# Altium footprint library MyPCBLib.PcbLib: 168 footprints (part 3 of 11)
Each footprint in its own frame and in the unit in brackets; x right, y up, seen from the top. Pads: shape width x height; smd on the part's side, far side on the other; paste and mask are expansions set on the pad; w line width, h text height; cw(c..) or ccw(c..) is an arc to the next point about the centre after c.
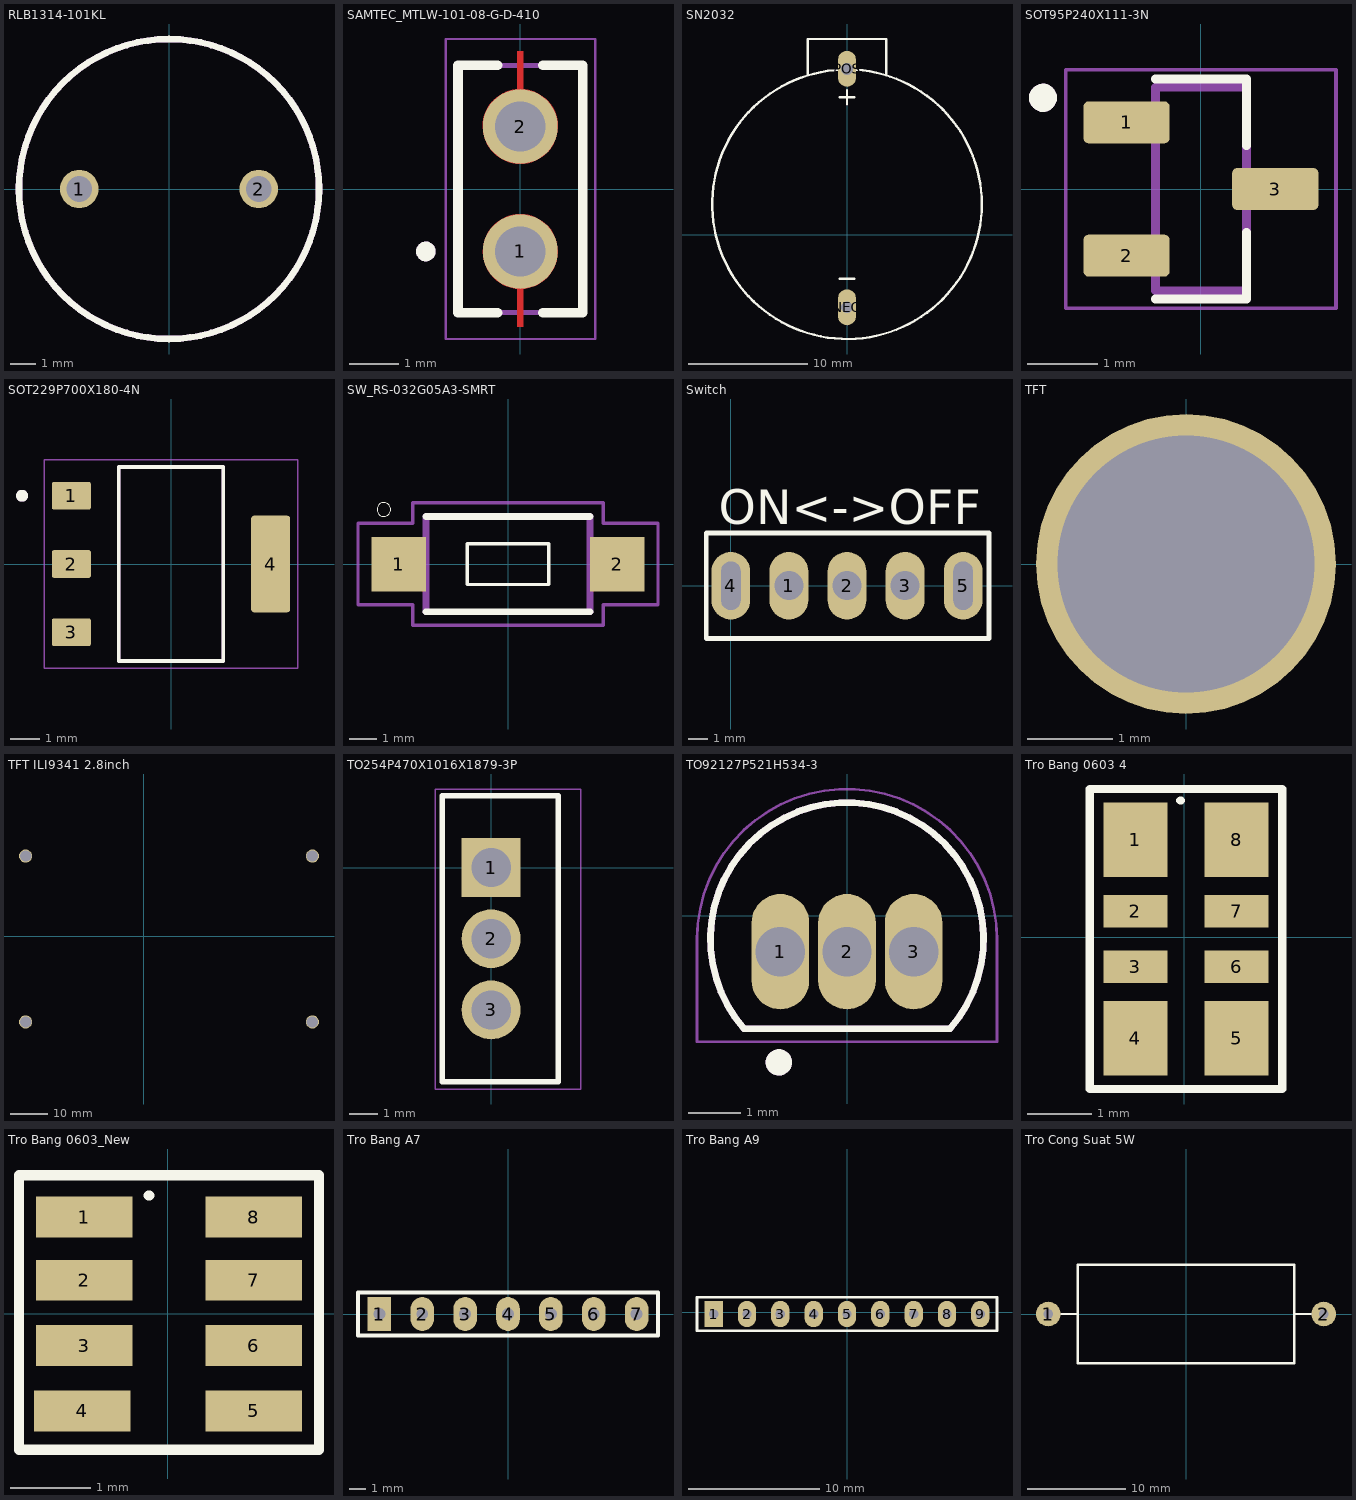
[diagram p2: the footprints below, top view; thin cyan lines are the x and y axes]

## RLB1314-101KL [mm]
pads (2):
  round 1.5 hole 1: 1(-3.5,0) 2(3.5,0)
Top Overlay:
  circle w0.254: c0,0 r5.85
Mechanical 13:
  circle w0.254: c0,0 r5.85
3D body "RLB1314-101KL.stp": height 13, standoff -20, extent -5.85,-5.85 5.85,5.85

## SAMTEC_MTLW-101-08-G-D-410 [mm]
pads (2):
  round 1.52 hole 1.02: 1(0,-1.27) 2(0,1.27)
Top Layer:
  region: 0.079,-0.514 0.158,-0.527 0.235,-0.547 0.309,-0.576 0.38,-0.612 0.447,-0.655 0.509,-0.705 0.565,-0.761 0.615,-0.823 0.658,-0.89 0.694,-0.961 0.723,-1.035 0.743,-1.112 0.756,-1.191 0.76,-1.27 0.759,-1.308 0.756,-1.346 0.752,-1.383 0.745,-1.421 0.737,-1.457 0.727,-1.494 0.715,-1.529 0.701,-1.564 0.686,-1.599 0.669,-1.633 0.65,-1.665 0.63,-1.697 0.608,-1.728 0.585,-1.757 0.56,-1.786 0.534,-1.813 0.506,-1.839 0.477,-1.863 0.448,-1.886 0.417,-1.908 0.385,-1.928 0.352,-1.946 0.318,-1.962 0.283,-1.977 0.248,-1.991 0.212,-2.002 0.176,-2.012 0.139,-2.02 0.102,-2.026 0.065,-2.03 0.065,-2.8 -0.065,-2.8 -0.065,-2.03 -0.102,-2.026 -0.139,-2.02 -0.176,-2.012 -0.212,-2.002 -0.248,-1.991 -0.283,-1.977 -0.318,-1.962 -0.352,-1.946 -0.385,-1.928 -0.417,-1.908 -0.448,-1.886 -0.477,-1.863 -0.506,-1.839 -0.534,-1.813 -0.56,-1.786 -0.585,-1.757 -0.608,-1.728 -0.63,-1.697 -0.65,-1.665 -0.669,-1.633 -0.686,-1.599 -0.701,-1.564 -0.715,-1.529 -0.727,-1.494 -0.737,-1.457 -0.745,-1.421 -0.752,-1.383 -0.756,-1.346 -0.759,-1.308 -0.76,-1.27 -0.756,-1.191 -0.743,-1.112 -0.723,-1.035 -0.694,-0.961 -0.658,-0.89 -0.615,-0.823 -0.565,-0.761 -0.509,-0.705 -0.447,-0.655 -0.38,-0.612 -0.309,-0.576 -0.235,-0.547 -0.158,-0.527 -0.079,-0.514 0,-0.51
  region: 0.065,2.03 0.094,2.027 0.128,2.022 0.163,2.016 0.197,2.008 0.23,1.998 0.263,1.987 0.296,1.975 0.328,1.961 0.359,1.945 0.39,1.928 0.42,1.91 0.449,1.89 0.476,1.869 0.503,1.847 0.529,1.823 0.554,1.799 0.578,1.773 0.6,1.746 0.621,1.718 0.641,1.69 0.66,1.66 0.677,1.63 0.693,1.598 0.707,1.566 0.72,1.534 0.731,1.501 0.741,1.467 0.749,1.433 0.756,1.399 0.76,1.37 0.76,1.27 0.759,1.23 0.756,1.191 0.751,1.151 0.743,1.112 0.734,1.073 0.723,1.035 0.71,0.998 0.694,0.961 0.677,0.925 0.658,0.89 0.637,0.856 0.615,0.823 0.591,0.792 0.565,0.761 0.537,0.733 0.509,0.705 0.478,0.679 0.447,0.655 0.414,0.633 0.38,0.612 0.345,0.593 0.309,0.576 0.272,0.56 0.235,0.547 0.197,0.536 0.158,0.527 0.119,0.519 0.079,0.514 0.04,0.511 0,0.51 -0.04,0.511 -0.079,0.514 -0.119,0.519 -0.158,0.527 -0.197,0.536 -0.235,0.547 -0.272,0.56 -0.309,0.576 -0.345,0.593 -0.38,0.612 -0.414,0.633 -0.447,0.655 -0.478,0.679 -0.509,0.705 -0.537,0.733 -0.565,0.761 -0.591,0.792 -0.615,0.823 -0.637,0.856 -0.658,0.89 -0.677,0.925 -0.694,0.961 -0.71,0.998 -0.723,1.035 -0.734,1.073 -0.743,1.112 -0.751,1.151 -0.756,1.191 -0.759,1.23 -0.76,1.27 -0.76,1.37 -0.756,1.399 -0.749,1.433 -0.741,1.467 -0.731,1.501 -0.72,1.534 -0.707,1.566 -0.693,1.598 -0.677,1.63 -0.66,1.66 -0.641,1.69 -0.621,1.718 -0.6,1.746 -0.578,1.773 -0.554,1.799 -0.529,1.823 -0.503,1.847 -0.476,1.869 -0.449,1.89 -0.42,1.91 -0.39,1.928 -0.359,1.945 -0.328,1.961 -0.296,1.975 -0.263,1.987 -0.23,1.998 -0.197,2.008 -0.163,2.016 -0.128,2.022 -0.094,2.027 -0.065,2.03 -0.065,2.8 0.065,2.8
Top Overlay:
  circle w0.2: c-1.92,-1.27 r0.1
  lines w0.2: -0.465,-2.515 -1.27,-2.515 -1.27,2.515 -0.465,2.515 ; 0.465,-2.515 1.27,-2.515 1.27,2.515 0.465,2.515
Top Paste:
  region: 1.08,-1.725 0.62,-1.725 0.255,-2.04 0.255,-2.8 -0.255,-2.8 -0.255,-2.04 -0.62,-1.725 -1.08,-1.725 -1.08,-0.185 1.08,-0.185
  region: 0.255,2.04 0.62,1.725 1.08,1.725 1.08,0.185 -1.08,0.185 -1.08,1.725 -0.62,1.725 -0.255,2.04 -0.255,2.8 0.255,2.8
Top Solder:
  drawing of 2 lines, arcs and shapes, not listed
Mechanical 13:
  circle w0.2: c-1.92,-1.27 r0.1
  lines w0.1: -1.27,-2.515 -1.27,2.515 1.27,2.515 1.27,-2.515 -1.27,-2.515
Mechanical 15:
  lines w0.05: -1.52,-3.05 -1.52,3.05 1.52,3.05 1.52,-3.05 -1.52,-3.05

## SN2032 [mm]
pads (2):
  oval 1.508x3.016 hole 1: NEG(0,-6.1) POS(0,13.9)
Top Overlay:
  circle w0.203: c0,2.54 r11.3
  lines w0.203: -3.3,13.34 -3.3,16.4 3.3,16.4 3.3,13.34 ; -0.6,-3.715 0.6,-3.715 ; -0.6,11.515 0.6,11.515 ; 0,10.915 0,12.115

## SOT95P240X111-3N [mm]
height 1.11
pads (3):
  rrect25% 1.23x0.6 smd: 1(-1.06,0.95) 2(-1.06,-0.95) 3(1.06,0)
Top Overlay:
  circle w0.2: c-2.25,1.3 r0.1
  lines w0.127: -0.65,-1.57 0.65,-1.57 0.65,-0.62 ; -0.65,1.57 0.65,1.57 0.65,0.62
Mechanical 13:
  circle w0.2: c-2.25,1.3 r0.1
  lines w0.127: -0.65,-1.45 -0.65,1.45 0.65,1.45 0.65,-1.45 -0.65,-1.45
Mechanical 15:
  lines w0.05: -1.925,-1.7 1.925,-1.7 1.925,1.7 -1.925,1.7 -1.925,-1.7
3D body "step_temp.STEP": height 1.11, standoff 0, extent -1.2,-1.45 1.2,1.45

## SOT229P700X180-4N [mm]
height 1.8
pads (4):
  rrect15% 1.31x0.93 smd: 1(-3.345,2.29) 2(-3.345,0) 3(-3.345,-2.29)
  rrect15% 1.31x3.24 smd: 4(3.345,0)
Top Overlay:
  circle w0.2: c-5,2.29 r0.1
  lines w0.127: -1.753,-3.253 1.753,-3.253 1.753,3.253 -1.753,3.253 -1.753,-3.253
Mechanical 13:
  circle w0.2: c-5,2.29 r0.1
  lines w0.127: -1.753,-3.253 1.753,-3.253 1.753,3.253 -1.753,3.253 -1.753,-3.253
Mechanical 15:
  lines w0.05: -4.25,-3.502 -4.25,3.502 4.25,3.502 4.25,-3.502 -4.25,-3.502
3D body "step_temp.STEP": height 1.8, standoff 0, extent -3.499,-3.251 3.499,3.251

## SW_RS-032G05A3-SMRT [mm]
pads (2):
  rect 2x2 smd: 1(-4,0) 2(4,0)
Top Overlay:
  circle w0: c-4.55,2 r0.254
  lines w0.127: -1.5,-0.75 -1.5,0.75 1.5,0.75 1.5,-0.75 -1.5,-0.75
  lines w0.254: -3,-1.75 3,-1.75 ; -3,1.75 3,1.75
Mechanical 13:
  lines w0.254: -3,-1.75 -3,1.75 ; 3,-1.75 3,1.75
Mechanical 15:
  lines w0.127: -5.5,-1.5 -5.5,1.5 -3.5,1.5 -3.5,2.25 3.5,2.25 3.5,1.5 5.5,1.5 5.5,-1.5 3.5,-1.5 3.5,-2.25 -3.5,-2.25 -3.5,-1.5 -5.5,-1.5

## Switch [mm]
pads (5):
  oval 2x3.5 hole 1.5: 1(3,0) 2(6,0) 3(9,0)
  oval 2x3.5 hole 1 slot 2.5 at 90 deg: 4(0,0) 5(12,0)
Top Overlay:
  lines w0.254: -1.27,-2.73 -1.27,2.73 13.335,2.73 13.335,-2.73 -1.27,-2.73
  text "ON<->OFF" at -0.635,3.175 h1.8
3D body "User Library-Assem1-20.STEP": height 2.6, standoff -6, extent -0.5,-2.85 12.5,9.35

## TFT [mm]
pads (1):
  round 3.5 hole 3: ""(0,0)

## TFT ILI9341 2.8inch [mm] "tft lcd 240x320"
pads (4):
  round 3.5 hole 3: ""(-31.295,-22.715) ""(-31.295,21.285) ""(44.785,-22.715) ""(44.785,21.285)

## TO254P470X1016X1879-3P [mm]
pads (3):
  rect 2.1x2.1 / inner round 2.1 / far side rect 2.1x2.1 hole 1.4: 1(0,0)
  round 2.1 hole 1.4: 2(0,-2.54) 3(0,-5.08)
Top Overlay:
  lines w0.2: -1.745,-7.64 2.395,-7.64 2.395,2.56 -1.745,2.56 -1.745,-7.64
Mechanical 15:
  lines w0.05: -2,-7.9 3.2,-7.9 3.2,2.8 -2,2.8 -2,-7.9
3D body "step_temp.STEP": height 20.4, standoff -9.94, extent -2.572,-7.493 1.778,2.667

## TO92127P521H534-3 [mm]
pads (3):
  oval 1.1x2.2 hole 0.94: 1(-1.27,-0.69) 2(0,-0.69) 3(1.27,-0.69)
Top Overlay:
  circle w0.3: c-1.3,-2.8 r0.1
  lines w0.127: -1.965,-2.158 cw(c0,-0.45) 1.965,-2.158 -1.965,-2.158
Mechanical 13:
  circle w0.3: c-1.3,-2.8 r0.1
  lines w0.127: -1.965,-2.158 cw(c0,-0.45) 1.965,-2.158 -1.965,-2.158
Mechanical 15:
  lines w0.05: -2.86,-2.41 2.86,-2.41 2.86,-0.448 ccw(c0,-0.448) -2.86,-0.448 -2.86,-2.41

## Tro Bang 0603 4 [mil]
height 300
pads (8):
  rect 39.37x45.67 smd: 1(-30,60) 4(-30,-62) 5(32,-62) 8(32,60)
  rect 39.37x20 smd: 2(-30.06,16.08) 3(-30,-18.08) 6(32.06,-18.08) 7(32.06,16.08)
Top Overlay:
  lines w5: -2.5,84 -2,84 ; -58,-93 -58,91 -47.81,91 -37.44,91 -27.25,91 60,91 60,-93 -58,-93
3D body "Tro bang smd0805.step": height 21.65, standoff 0, extent -29.5,-63.98 33.5,62

## Tro Bang 0603_New [mil]
pads (8):
  rect 47.24x20 smd: 1(-41,47.5) 2(-41,16.5) 3(-41,-15.5) 4(-42,-47.5) 5(42,-47.5) 6(42,-15.5) 7(42,16.5) 8(42,47.5)
Top Overlay:
  lines w5: -9.5,58 -9,58 ; -73,-66.5 -73,68 -35,68 74,68 74,-66.5 -73,-66.5
3D body "Tro bang smd0805.step": height 21.65, standoff 0, extent -31.5,-60.49 31.5,65.5

## Tro Bang A7 [mm]
pads (7):
  rect 1.4x2 hole 0.7: 1(-7.62,0)
  oval 1.4x2 hole 0.7: 2(-5.08,0) 3(-2.54,0) 4(0,0) 5(2.54,0) 6(5.08,0) 7(7.62,0)
Top Overlay:
  lines w0.254: -8.89,-1.27 8.89,-1.27 8.89,1.27 -8.89,1.27 -8.89,-1.27
3D body "68010.stp": height 5.94, standoff -2.44, extent -8.865,-1.22 8.865,1.27

## Tro Bang A9 [mm]
pads (9):
  rect 1.4x2 hole 0.7: 1(-10.16,-0.127)
  oval 1.4x2 hole 0.7: 2(-7.62,-0.127) 3(-5.08,-0.127) 4(-2.54,-0.127) 5(0,-0.127) 6(2.54,-0.127) 7(5.08,-0.127) 8(7.62,-0.127) 9(10.16,-0.127)
Top Overlay:
  lines w0.2: -11.43,-1.397 -11.43,1.143 11.43,1.143 11.43,-1.397 -11.43,-1.397
3D body "Tro bang 9.step": height 5.57, standoff -2.93, extent -11.25,-0.762 11.25,0.488

## Tro Cong Suat 5W [mm]
pads (2):
  round 2.5 hole 1: 1(-14,0) 2(14,0)
Top Overlay:
  lines w0.254: -12.7,0 -11.049,0 ; 11.049,0 12.827,0 ; -11,-5 -11,5 11,5 11,-5 -11,-5
3D body "Resistors 5W.step": height 9, standoff -3.6, extent -14.345,-5 14.345,5